# Altium footprint library Wurth_Elektronik_Electromechanic_Wire_to_Board_Connectors_rev16a.PCBLIB: 662 footprints (part 14 of 42)
Each footprint in its own frame and in the unit in brackets; x right, y up, seen from the top. Pads: shape width x height; smd on the part's side, far side on the other; paste and mask are expansions set on the pad; w line width, h text height; cw(c..) or ccw(c..) is an arc to the next point about the centre after c.
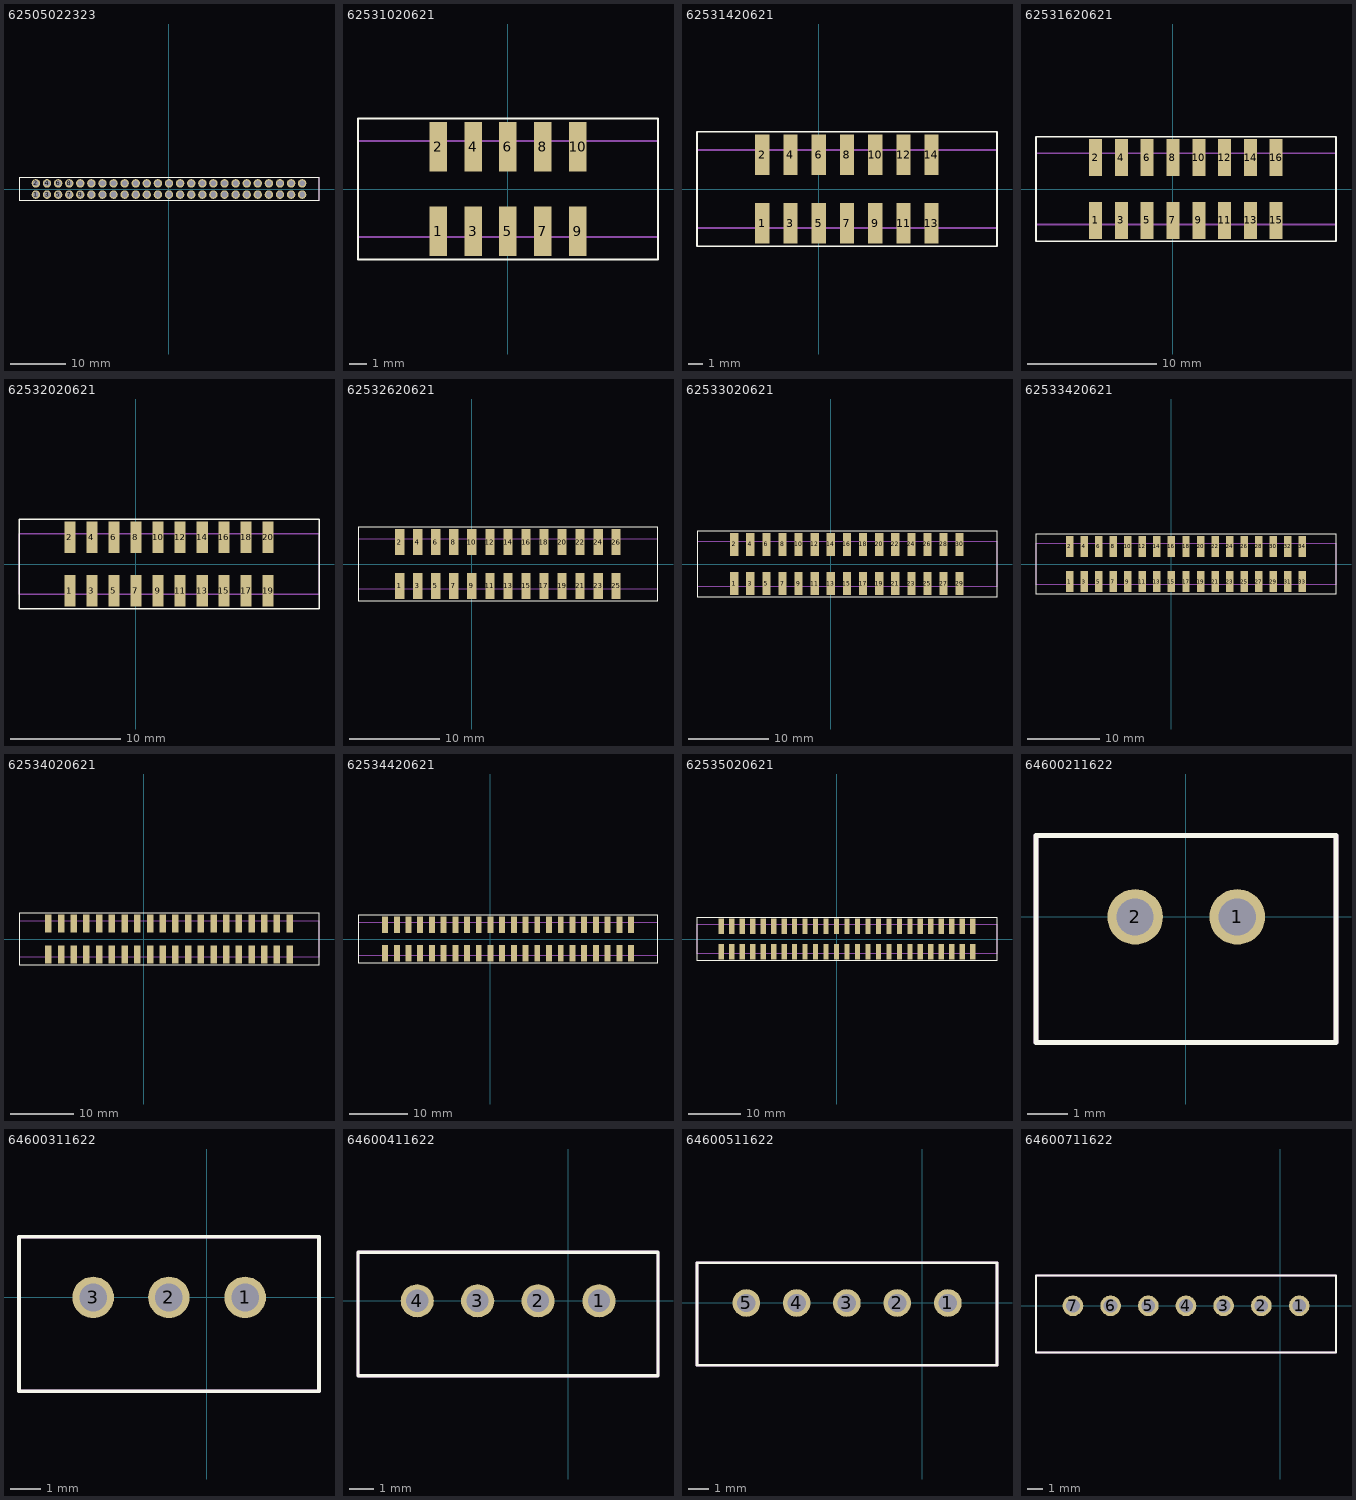
[diagram p13: the footprints below, top view; thin cyan lines are the x and y axes]

## 62505022323 [mil]
pads (50):
  round 60 hole 40: 1(-944.88,-39.37) 2(-944.88,40) 3(-866.14,-39.37) 4(-866.14,40) 5(-787.4,-39.37) 6(-787.4,40) 7(-708.66,-39.37) 8(-708.66,40) 9(-629.92,-39.37) 10(-629.92,40) 11(-551.18,-39.37) 12(-551.18,40) 13(-472.44,-39.37) 14(-472.44,40) 15(-393.7,-39.37) 16(-393.7,40) 17(-314.96,-39.37) 18(-314.96,40) 19(-236.22,-39.37) 20(-236.22,40) 21(-157.48,-39.37) 22(-157.48,40) 23(-78.74,-39.37) 24(-78.74,40) 25(0,-39.37) 26(0,40) 27(79,-39.37) 28(79,40) 29(158,-39.37) 30(158,40) 31(237,-39.37) 32(237,40) 33(315,-39.37) 34(315,40) 35(394,-39.37) 36(394,40) 37(473,-39.37) 38(473,40) 39(552,-39.37) 40(552,40) 41(630,-39.37) 42(630,40) 43(709,-39.37) 44(709,40) 45(788,-39.37) 46(788,40) 47(867,-39.37) 48(867,40) 49(945,-39.37) 50(945,40)
Top Overlay:
  lines w5: -1064.96,-78.74 1065,-78.74 1065,79 -1064.96,79 -1064.96,-78.74
Mechanical 2:
  text ">NAME" at -98.62,113 h77.5
Mechanical 4:
  text ">VALUE" at -98.62,-152.17 h77.5
Mechanical 16:
  lines w5: -1064.96,-78.74 -1064.96,79 1065,79 1065,-78.74 -1064.96,-78.74
  text "1" at -964.57,-59.06 h77.5
  text "50" at 920,20 h77.5

## 62531020621 [mil]
pads (10):
  rect 40x113 smd: 1(-157.48,-95.47) 2(-157.48,96) 3(-78.74,-95.47) 4(-78.74,96) 5(0,-95.47) 6(0,96) 7(79,-95.47) 8(79,96) 9(158,-95.47) 10(158,96)
Top Overlay:
  lines w5: -339.57,-159.45 340,-159.45 340,160 -339.57,160 -339.57,-159.45
Mechanical 2:
  text ">NAME" at -112.2,185 h77.5
Mechanical 4:
  text ">VALUE" at -83.66,-234.25 h77.5
Mechanical 16:
  lines w5: -339.57,-108.27 -339.57,109 340,109 340,-108.27 -339.57,-108.27
  text "1" at -184.06,-83.66 h77.5
  text "10" at 118,34 h77.5

## 62531420621 [mil]
pads (14):
  rect 40x113 smd: 1(-157.48,-95.47) 2(-157.48,96) 3(-78.74,-95.47) 4(-78.74,96) 5(0,-95.47) 6(0,96) 7(79,-95.47) 8(79,96) 9(158,-95.47) 10(158,96) 11(237,-95.47) 12(237,96) 13(315,-95.47) 14(315,96)
Top Overlay:
  lines w5: -339.57,-159.45 498,-159.45 498,160 -339.57,160 -339.57,-159.45
Mechanical 2:
  text ">NAME" at -33.46,185 h77.5
Mechanical 4:
  text ">VALUE" at -44.29,-234.25 h77.5
Mechanical 16:
  lines w5: -339.57,-108.27 -339.57,109 498,109 498,-108.27 -339.57,-108.27
  text "1" at -184.06,-83.66 h77.5
  text "14" at 275,34 h77.5

## 62531620621 [mil]
pads (16):
  rect 40x113 smd: 1(-236.22,-95.47) 2(-236.22,96) 3(-157.48,-95.47) 4(-157.48,96) 5(-78.74,-95.47) 6(-78.74,96) 7(0,-95.47) 8(0,96) 9(79,-95.47) 10(79,96) 11(158,-95.47) 12(158,96) 13(237,-95.47) 14(237,96) 15(315,-95.47) 16(315,96)
Top Overlay:
  lines w5: -418.31,-159.45 498,-159.45 498,160 -418.31,160 -418.31,-159.45
Mechanical 2:
  text ">NAME" at -37.2,185 h77.5
Mechanical 4:
  text ">VALUE" at -73.03,-234.25 h77.5
Mechanical 16:
  lines w5: -418.31,-108.27 -418.31,109 498,109 498,-108.27 -418.31,-108.27
  text "1" at -262.8,-83.66 h77.5
  text "16" at 271,34 h77.5

## 62532020621 [mil]
pads (20):
  rect 40x113 smd: 1(-236.22,-95.47) 2(-236.22,96) 3(-157.48,-95.47) 4(-157.48,96) 5(-78.74,-95.47) 6(-78.74,96) 7(0,-95.47) 8(0,96) 9(79,-95.47) 10(79,96) 11(158,-95.47) 12(158,96) 13(237,-95.47) 14(237,96) 15(315,-95.47) 16(315,96) 17(394,-95.47) 18(394,96) 19(473,-95.47) 20(473,96)
Top Overlay:
  lines w5: -418.31,-159.45 655,-159.45 655,160 -418.31,160 -418.31,-159.45
Mechanical 2:
  text ">NAME" at 38,185 h77.5
Mechanical 4:
  text ">VALUE" at 52,-234.25 h77.5
Mechanical 16:
  lines w5: -418.31,-108.27 -418.31,109 655,109 655,-108.27 -418.31,-108.27
  text "1" at -262.8,-83.66 h77.5
  text "20" at 446,34 h77.5

## 62532620621 [mil]
pads (26):
  rect 40x113 smd: 1(-314.96,-95.47) 2(-314.96,96) 3(-236.22,-95.47) 4(-236.22,96) 5(-157.48,-95.47) 6(-157.48,96) 7(-78.74,-95.47) 8(-78.74,96) 9(0,-95.47) 10(0,96) 11(79,-95.47) 12(79,96) 13(158,-95.47) 14(158,96) 15(237,-95.47) 16(237,96) 17(315,-95.47) 18(315,96) 19(394,-95.47) 20(394,96) 21(473,-95.47) 22(473,96) 23(552,-95.47) 24(552,96) 25(630,-95.47) 26(630,96)
Top Overlay:
  lines w5: -497.05,-159.45 813,-159.45 813,160 -497.05,160 -497.05,-159.45
Mechanical 2:
  text ">NAME" at 110,185 h77.5
Mechanical 4:
  text ">VALUE" at 99,-234.25 h77.5
Mechanical 16:
  lines w5: -497.05,-108.27 -497.05,109 813,109 813,-108.27 -497.05,-108.27
  text "1" at -341.54,-83.66 h77.5
  text "26" at 593,34 h77.5

## 62533020621 [mil]
pads (30):
  rect 40x113 smd: 1(-472.44,-95.47) 2(-472.44,96) 3(-393.7,-95.47) 4(-393.7,96) 5(-314.96,-95.47) 6(-314.96,96) 7(-236.22,-95.47) 8(-236.22,96) 9(-157.48,-95.47) 10(-157.48,96) 11(-78.74,-95.47) 12(-78.74,96) 13(0,-95.47) 14(0,96) 15(79,-95.47) 16(79,96) 17(158,-95.47) 18(158,96) 19(237,-95.47) 20(237,96) 21(315,-95.47) 22(315,96) 23(394,-95.47) 24(394,96) 25(473,-95.47) 26(473,96) 27(552,-95.47) 28(552,96) 29(630,-95.47) 30(630,96)
Top Overlay:
  lines w5: -654.53,-159.45 813,-159.45 813,160 -654.53,160 -654.53,-159.45
Mechanical 2:
  text ">NAME" at -23.43,185 h77.5
Mechanical 4:
  text ">VALUE" at -34.25,-234.25 h77.5
Mechanical 16:
  lines w5: -654.53,-108.27 -654.53,109 813,109 813,-108.27 -654.53,-108.27
  text "1" at -499.02,-83.66 h77.5
  text "30" at 585,34 h77.5

## 62533420621 [mil]
pads (34):
  rect 40x113 smd: 1(-551.18,-95.47) 2(-551.18,96) 3(-472.44,-95.47) 4(-472.44,96) 5(-393.7,-95.47) 6(-393.7,96) 7(-314.96,-95.47) 8(-314.96,96) 9(-236.22,-95.47) 10(-236.22,96) 11(-157.48,-95.47) 12(-157.48,96) 13(-78.74,-95.47) 14(-78.74,96) 15(0,-95.47) 16(0,96) 17(79,-95.47) 18(79,96) 19(158,-95.47) 20(158,96) 21(237,-95.47) 22(237,96) 23(315,-95.47) 24(315,96) 25(394,-95.47) 26(394,96) 27(473,-95.47) 28(473,96) 29(552,-95.47) 30(552,96) 31(630,-95.47) 32(630,96) 33(709,-95.47) 34(709,96)
Top Overlay:
  lines w5: -733.27,-159.45 891,-159.45 891,160 -733.27,160 -733.27,-159.45
Mechanical 2:
  text ">NAME" at -27.17,185 h77.5
Mechanical 4:
  text ">VALUE" at -37.99,-234.25 h77.5
Mechanical 16:
  lines w5: -733.27,-108.27 -733.27,109 891,109 891,-108.27 -733.27,-108.27
  text "1" at -577.76,-83.66 h77.5
  text "34" at 681,34 h77.5

## 62534020621 [mil]
pads (40):
  rect 40x113 smd: 1(-590.55,-95.47) 2(-590.55,96) 3(-511.81,-95.47) 4(-511.81,96) 5(-433.07,-95.47) 6(-433.07,96) 7(-354.33,-95.47) 8(-354.33,96) 9(-275.59,-95.47) 10(-275.59,96) 11(-196.85,-95.47) 12(-196.85,96) 13(-118.11,-95.47) 14(-118.11,96) 15(-39.37,-95.47) 16(-39.37,96) 17(40,-95.47) 18(40,96) 19(119,-95.47) 20(119,96) 21(197,-95.47) 22(197,96) 23(276,-95.47) 24(276,96) 25(355,-95.47) 26(355,96) 27(434,-95.47) 28(434,96) 29(512,-95.47) 30(512,96) 31(591,-95.47) 32(591,96) 33(670,-95.47) 34(670,96) 35(749,-95.47) 36(749,96) 37(827,-95.47) 38(827,96) 39(906,-95.47) 40(906,96)
Top Overlay:
  lines w5: -772.64,-159.45 1088,-159.45 1088,160 -772.64,160 -772.64,-159.45
Mechanical 2:
  text ">NAME" at -66.54,185 h77.5
Mechanical 4:
  text ">VALUE" at -77.36,-234.25 h77.5
Mechanical 16:
  lines w5: -772.64,-108.27 -772.64,109 1088,109 1088,-108.27 -772.64,-108.27
  text "1" at -617.13,-83.66 h77.5
  text "40" at 867,34 h77.5

## 62534420621 [mil]
pads (44):
  rect 40x113 smd: 1(-708.66,-95.47) 2(-708.66,96) 3(-629.92,-95.47) 4(-629.92,96) 5(-551.18,-95.47) 6(-551.18,96) 7(-472.44,-95.47) 8(-472.44,96) 9(-393.7,-95.47) 10(-393.7,96) 11(-314.96,-95.47) 12(-314.96,96) 13(-236.22,-95.47) 14(-236.22,96) 15(-157.48,-95.47) 16(-157.48,96) 17(-78.74,-95.47) 18(-78.74,96) 19(0,-95.47) 20(0,96) 21(79,-95.47) 22(79,96) 23(158,-95.47) 24(158,96) 25(237,-95.47) 26(237,96) 27(315,-95.47) 28(315,96) 29(394,-95.47) 30(394,96) 31(473,-95.47) 32(473,96) 33(552,-95.47) 34(552,96) 35(630,-95.47) 36(630,96) 37(709,-95.47) 38(709,96) 39(788,-95.47) 40(788,96) 41(867,-95.47) 42(867,96) 43(945,-95.47) 44(945,96)
Top Overlay:
  lines w5: -890.75,-159.45 1127,-159.45 1127,160 -890.75,160 -890.75,-159.45
Mechanical 2:
  text ">NAME" at -184.65,185 h77.5
Mechanical 4:
  text ">VALUE" at -195.47,-234.25 h77.5
Mechanical 16:
  lines w5: -890.75,-108.27 -890.75,109 1127,109 1127,-108.27 -890.75,-108.27
  text "1" at -735.24,-83.66 h77.5
  text "44" at 899,34 h77.5

## 62535020621 [mil]
pads (50):
  rect 40x113 smd: 1(-866.14,-95.47) 2(-866.14,96) 3(-787.4,-95.47) 4(-787.4,96) 5(-708.66,-95.47) 6(-708.66,96) 7(-629.92,-95.47) 8(-629.92,96) 9(-551.18,-95.47) 10(-551.18,96) 11(-472.44,-95.47) 12(-472.44,96) 13(-393.7,-95.47) 14(-393.7,96) 15(-314.96,-95.47) 16(-314.96,96) 17(-236.22,-95.47) 18(-236.22,96) 19(-157.48,-95.47) 20(-157.48,96) 21(-78.74,-95.47) 22(-78.74,96) 23(0,-95.47) 24(0,96) 25(79,-95.47) 26(79,96) 27(158,-95.47) 28(158,96) 29(237,-95.47) 30(237,96) 31(315,-95.47) 32(315,96) 33(394,-95.47) 34(394,96) 35(473,-95.47) 36(473,96) 37(552,-95.47) 38(552,96) 39(630,-95.47) 40(630,96) 41(709,-95.47) 42(709,96) 43(788,-95.47) 44(788,96) 45(867,-95.47) 46(867,96) 47(945,-95.47) 48(945,96) 49(1024,-95.47) 50(1024,96)
Top Overlay:
  lines w5: -1048.23,-159.45 1206,-159.45 1206,160 -1048.23,160 -1048.23,-159.45
Mechanical 2:
  text ">NAME" at -92.13,185 h77.5
Mechanical 4:
  text ">VALUE" at -102.95,-234.25 h77.5
Mechanical 16:
  lines w5: -1048.23,-108.27 -1048.23,109 1206,109 1206,-108.27 -1048.23,-108.27
  text "1" at -892.72,-83.66 h77.5
  text "50" at 991,34 h77.5

## 64600211622 [mil]
pads (2):
  round 54 hole 36: 1(50,0) 2(-49.21,0)
Top Overlay:
  lines w5: -145.67,-122.05 146,-122.05 146,79 -145.67,79 -145.67,-122.05
Mechanical 2:
  text ">NAME" at 176,0 h77.5
Mechanical 4:
  text ">VALUE" at 185,-77.95 h77.5
Mechanical 16:
  lines w5: -145.67,-122.05 146,-122.05 146,79 -145.67,79 -145.67,-122.05
  text "1" at 25,-24.61 h77.5
  text "2" at -73.82,-24.61 h77.5

## 64600311622 [mil]
pads (3):
  round 54 hole 36: 1(50,0) 2(-49.21,0) 3(-147.64,0)
Top Overlay:
  lines w5: -244.09,-122.05 146,-122.05 146,79 -244.09,79 -244.09,-122.05
Mechanical 2:
  text ">NAME" at 176,0 h77.5
Mechanical 4:
  text ">VALUE" at 185,-77.95 h77.5
Mechanical 16:
  lines w5: -244.09,-122.05 146,-122.05 146,79 -244.09,79 -244.09,-122.05
  text "1" at 25,-24.61 h77.5
  text "3" at -172.24,-24.61 h77.5

## 64600411622 [mil]
pads (4):
  round 54 hole 36: 1(50,0) 2(-49.21,0) 3(-147.64,0) 4(-246.06,0)
Top Overlay:
  lines w5: -342.52,-122.05 146,-122.05 146,79 -342.52,79 -342.52,-122.05
Mechanical 2:
  text ">NAME" at 176,0 h77.5
Mechanical 4:
  text ">VALUE" at 185,-77.95 h77.5
Mechanical 16:
  lines w5: -342.52,-122.05 146,-122.05 146,79 -342.52,79 -342.52,-122.05
  text "1" at 25,-24.61 h77.5
  text "4" at -270.67,-24.61 h77.5

## 64600511622 [mil]
pads (5):
  round 54 hole 36: 1(50,0) 2(-49.21,0) 3(-147.64,0) 4(-246.06,0) 5(-344.49,0)
Top Overlay:
  lines w5: -440.94,-122.05 146,-122.05 146,79 -440.94,79 -440.94,-122.05
Mechanical 2:
  text ">NAME" at 176,0 h77.5
Mechanical 4:
  text ">VALUE" at 185,-77.95 h77.5
Mechanical 16:
  lines w5: -440.94,-122.05 146,-122.05 146,79 -440.94,79 -440.94,-122.05
  text "1" at 25,-24.61 h77.5
  text "5" at -369.09,-24.61 h77.5

## 64600711622 [mil]
pads (7):
  round 54 hole 36: 1(50,0) 2(-49.21,0) 3(-147.64,0) 4(-246.06,0) 5(-344.49,0) 6(-442.91,0) 7(-541.34,0)
Top Overlay:
  lines w5: -637.8,-122.05 146,-122.05 146,79 -637.8,79 -637.8,-122.05
Mechanical 2:
  text ">NAME" at 176,0 h77.5
Mechanical 4:
  text ">VALUE" at 185,-77.95 h77.5
Mechanical 16:
  lines w5: -637.8,-122.05 146,-122.05 146,79 -637.8,79 -637.8,-122.05
  text "1" at 25,-24.61 h77.5
  text "7" at -565.94,-24.61 h77.5